# Altium footprint library tsl_Pcblib.PcbLib: 219 footprints (part 13 of 14)
Each footprint in its own frame and in the unit in brackets; x right, y up, seen from the top. Pads: shape width x height; smd on the part's side, far side on the other; paste and mask are expansions set on the pad; w line width, h text height; cw(c..) or ccw(c..) is an arc to the next point about the centre after c.
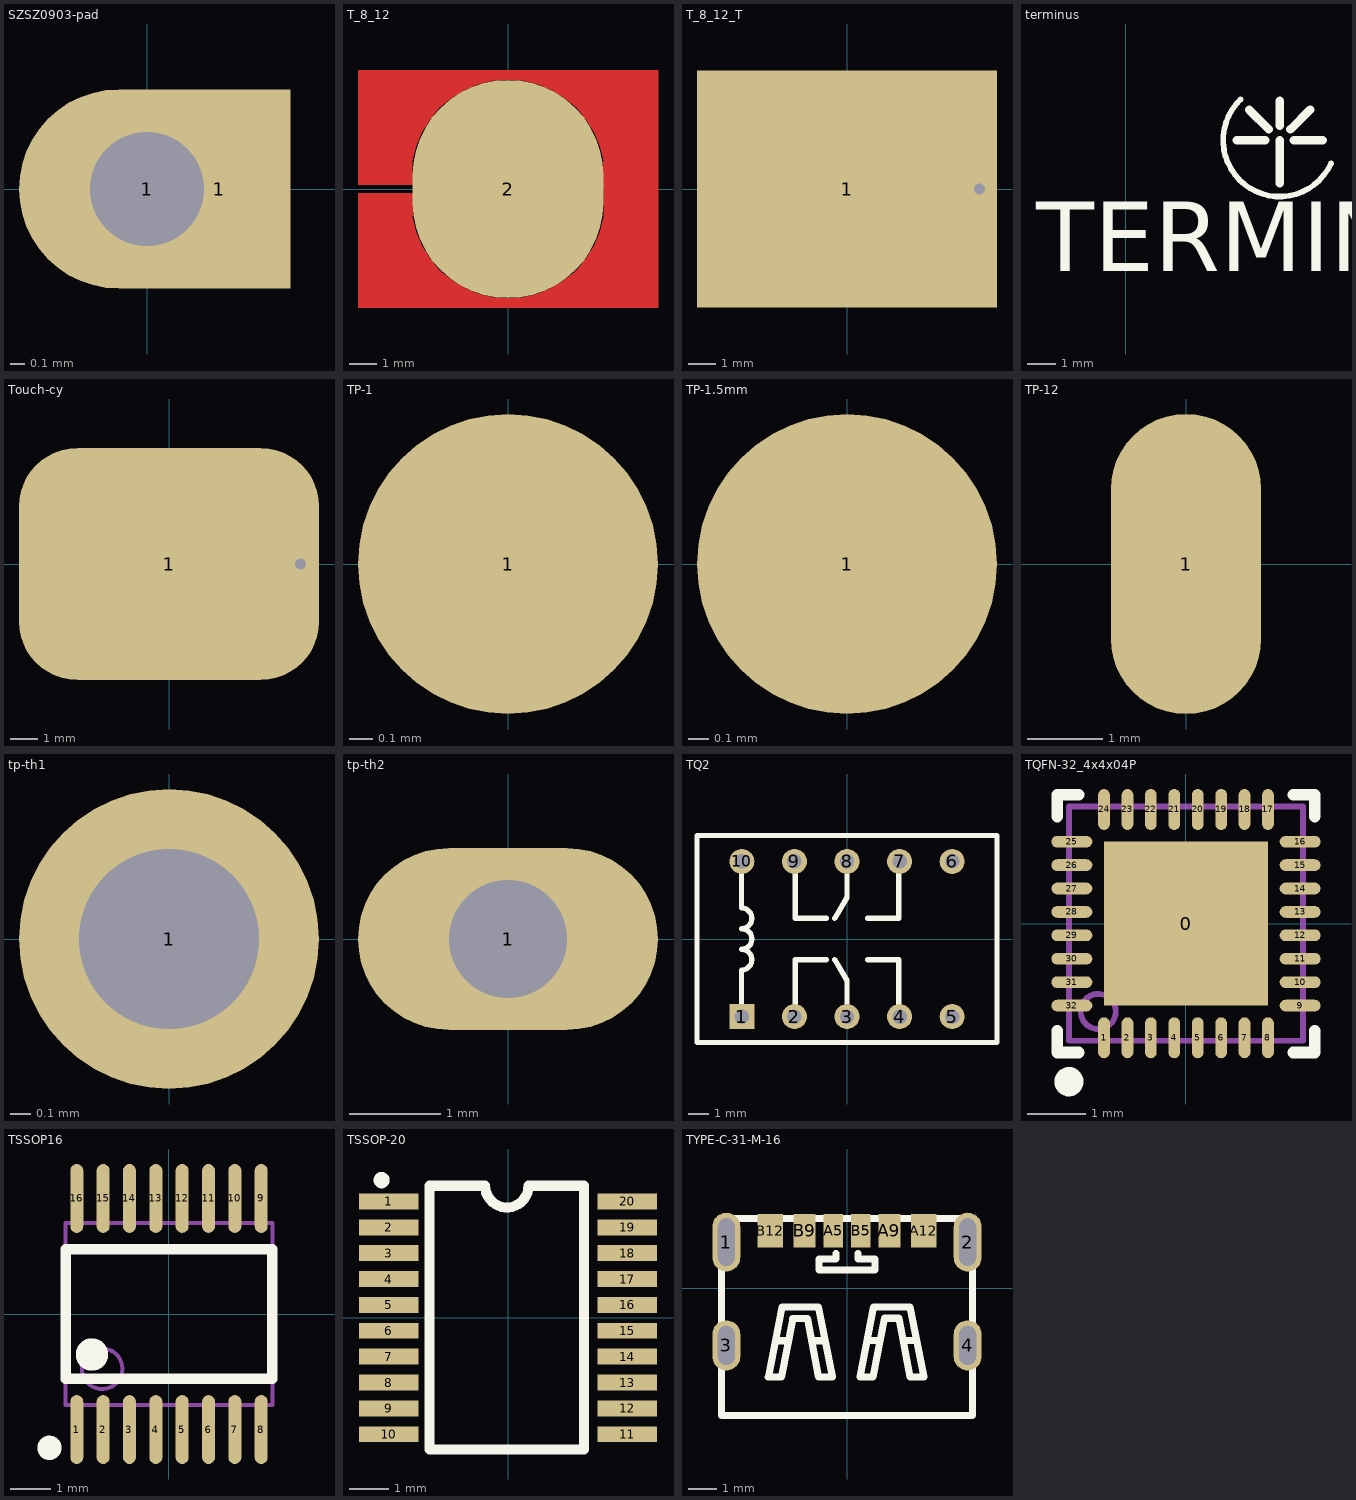
[diagram p12: the footprints below, top view; thin cyan lines are the x and y axes]

## SZSZ0903-pad [mm]
pads (2):
  oval 1.8x1.4 hole 0.8: 1(0,0)
  rect 1x1.4 smd: 1(0.508,0)

## T_8_12 [mm]
pads (2):
  round 0.01 smd: 1(-4.5,-3.4)
  oval 7x8 smd: 2(0,0)
Top Layer:
  region: 5.5,-4.35 5.5,4.35 -5.5,4.35 -5.5,0.15 -3.5,0.15 -3.51,1.003 -3.509,1.016 -3.378,1.558 -3.165,2.073 -2.874,2.548 -2.512,2.972 -2.088,3.334 -1.613,3.625 -1.098,3.838 -0.556,3.969 0,4.012 0.556,3.969 1.098,3.838 1.613,3.625 2.088,3.334 2.512,2.972 2.874,2.548 3.165,2.073 3.378,1.558 3.509,1.016 3.51,0.997 3.5,1 3.51,-1.003 3.509,-1.016 3.378,-1.558 3.165,-2.073 2.874,-2.548 2.512,-2.972 2.088,-3.334 1.613,-3.625 1.098,-3.838 0.556,-3.969 0,-4.012 -0.556,-3.969 -1.098,-3.838 -1.613,-3.625 -2.088,-3.334 -2.512,-2.972 -2.874,-2.548 -3.165,-2.073 -3.378,-1.558 -3.509,-1.016 -3.51,-0.997 -3.5,-1 -3.5,-0.15 -5.5,-0.15 -5.5,-4.35

## T_8_12_T [mil]
pads (1):
  rect 430x340 smd: 1(0,0)
via 190,0 diameter 30 hole 16

## terminus [mm]
Top Overlay:
  lines w0.2: 4.075,11.348 ccw(c5.461,9.906) 7.283,9.081
  lines w0.3: 3.937,9.906 4.953,9.906 ; 4.381,10.986 5.08,10.287 ; 5.461,8.382 5.461,9.906 ; 5.461,10.414 5.461,11.303 ; 5.842,10.287 6.54,10.986 ; 5.969,9.906 6.985,9.906
  text "TERMINUS" at -3.175,4.445 h4.2

## Touch-cy [mm]
pads (1):
  rrect50% 11x8.5 smd paste-12 mask-12: 1(0,0)
via 4.826,0 diameter 0.762 hole 0.406

## TP-1 [mm]
pads (1):
  round 1.3 smd: 1(0,0)

## TP-1.5mm [mm]
pads (1):
  round 1.5 smd: 1(0,0)

## TP-12 [mm]
pads (1):
  oval 2x4 smd: 1(0,0)

## tp-th1 [mm]
pads (1):
  round 1.5 hole 0.9: 1(0,0)

## tp-th2 [mm]
pads (1):
  oval 3.3x2 hole 1.3: 1(0,0)

## TQ2 [mm]
pads (10):
  rect 1.2x1.21 / inner rect 1.2x1.21 / far side rect 1.5x1.51 hole 0.7: 1(-5.08,-3.75)
  oval 1.2x1.21 / inner oval 1.2x1.21 / far side oval 1.5x1.51 hole 0.7: 2(-2.54,-3.75) 3(0,-3.75) 4(2.54,-3.75) 5(5.08,-3.75) 6(5.08,3.75) 7(2.54,3.75) 8(0,3.75) 9(-2.54,3.75) 10(-5.08,3.75)
Top Overlay:
  lines w0.254: -5.1,-3.7 -5.1,-1.5 ccw(c-5.1,-1) -5.1,-0.5 ccw(c-5.1,0) -5.1,0.5 ccw(c-5.1,1) -5.1,1.5 -5.1,3.7 ; -2.5,-3.7 -2.5,-1 -1,-1 ; -2.5,3.9 -2.5,1 -1,1 ; -0.6,-1 0,-2 0,-3.9 ; -0.6,1 0,2 0,3.6 ; 1,-1 2.5,-1 2.5,-3.7 ; 1,1 2.5,1 2.5,3.7 ; -7.25,-5 -7.25,5 7.25,5 7.25,-5 -7.25,-5

## TQFN-32_4X4 [mm]

## TQFN-32_4x4x04P [mm]
pads (33):
  rect 2.8x2.8 smd paste-0.025 mask+0.051: 0(0,0)
  oval 0.2x0.7 smd paste-0.025 mask+0.051: 1(-1.4,-1.95) 2(-1,-1.95) 3(-0.6,-1.95) 4(-0.2,-1.95) 5(0.2,-1.95) 6(0.6,-1.95) 7(1,-1.95) 8(1.4,-1.95) 17(1.4,1.95) 18(1,1.95) 19(0.6,1.95) 20(0.2,1.95) 21(-0.2,1.95) 22(-0.6,1.95) 23(-1,1.95) 24(-1.4,1.95)
  oval 0.7x0.2 smd paste-0.025 mask+0.051: 9(1.95,-1.4) 10(1.95,-1) 11(1.95,-0.6) 12(1.95,-0.2) 13(1.95,0.2) 14(1.95,0.6) 15(1.95,1) 16(1.95,1.4) 25(-1.95,1.4) 26(-1.95,1) 27(-1.95,0.6) 28(-1.95,0.2) 29(-1.95,-0.2) 30(-1.95,-0.6) 31(-1.95,-1) 32(-1.95,-1.4)
Top Overlay:
  circle w0.25: c-2,-2.7 r0.125
  lines w0.2: -2.2,-1.83 -2.2,-2.2 -1.83,-2.2 ; -2.2,1.83 -2.2,2.2 -1.83,2.2 ; 1.83,-2.2 2.2,-2.2 2.2,-1.83 ; 1.83,2.2 2.2,2.2 2.2,1.83
Mechanical 13:
  circle w0.1: c-1.5,-1.5 r0.3
  lines w0.1: -2,-2 -2,2 2,2 2,-2 -2,-2
3D body: height 0.25, standoff 0, extent -2.007,-1.981 2.007,2.007

## TSSOP16 [mm]
pads (16):
  oval 0.32x1.7 smd: 1(-2.275,-2.85) 2(-1.625,-2.85) 3(-0.975,-2.85) 4(-0.325,-2.85) 5(0.325,-2.85) 6(0.975,-2.85) 7(1.625,-2.85) 8(2.275,-2.85) 9(2.275,2.85) 10(1.625,2.85) 11(0.975,2.85) 12(0.325,2.85) 13(-0.325,2.85) 14(-0.975,2.85) 15(-1.625,2.85) 16(-2.275,2.85)
Top Overlay:
  circle w0.4: c-1.9,-1 r0.2
  circle w0.3: c-2.95,-3.3 r0.15
  lines w0.254: -2.55,-1.6 2.55,-1.6 2.55,1.6 -2.55,1.6 -2.55,-1.6
Mechanical 13:
  circle w0.1: c-1.65,-1.35 r0.5
  lines w0.1: -2.55,-2.25 2.55,-2.25 2.55,2.25 -2.55,2.25 -2.55,-2.25

## TSSOP-20 [mm]
pads (20):
  rect 1.494x0.4 smd: 1(-3.001,2.925) 2(-3.001,2.275) 3(-3.001,1.625) 4(-3.001,0.975) 5(-3.001,0.325) 6(-3.001,-0.324) 7(-3.001,-0.975) 8(-3.001,-1.625) 9(-3.001,-2.275) 10(-3.001,-2.925) 11(3.001,-2.925) 12(3.001,-2.275) 13(3.001,-1.625) 14(3.001,-0.975) 15(3.001,-0.325) 16(3.001,0.325) 17(3.001,0.975) 18(2.996,1.625) 19(2.996,2.275) 20(3.001,2.925)
Top Overlay:
  circle w0.254: c-3.176,3.458 r0.076
  lines w0.254: -1.972,3.291 -1.972,-3.311 1.914,-3.311 1.914,3.319 0.517,3.319 cw(c-0.029,3.319) -0.575,3.319 ; -1.972,3.319 -0.601,3.319

## TYPE-C-31-M-16 [mm]
pads (10):
  oval 1x2.1 hole 0.6 slot 1.7 at 90 deg: 1(-4.32,1.65) 2(4.32,1.65)
  oval 1x1.8 hole 0.6 slot 1.4 at 90 deg: 3(-4.32,-2.05) 4(4.32,-2.05)
  rect 0.7x1.2 smd: A5(-0.5,2.05) B5(0.5,2.05)
  rect 0.8x1.2 smd: A9(1.52,2.05) B9(-1.52,2.05)
  rect 0.9x1.2 smd: A12(2.75,2.05) B12(-2.75,2.05)
Top Overlay:
  lines w0.25: -4.5,-4.55 4.5,-4.55 ; -4.5,-4.5 -4.5,2.49 2.794,2.489 4.5,2.49 4.5,-4.5 ; -1.01,0.65 1.01,0.65 ; -1,0.65 -1,1.05 -0.4,1.05 -0.4,1.25 ; 0.4,1.25 0.4,1.05 1,1.05 1,0.65
  lines w0.254: -2.518,-1.883 -2.119,-1.883 ; -1.219,-1.882 -0.819,-1.882 ; 0.759,-1.878 1.158,-1.878 ; 2.058,-1.877 2.458,-1.877 ; -2.818,-3.183 -2.343,-3.183 -1.941,-1.083 -1.413,-1.083 -1.014,-3.183 -0.519,-3.183 -1.019,-0.681 -2.32,-0.681 -2.818,-3.183 ; 0.459,-3.178 0.934,-3.178 1.335,-1.078 1.864,-1.078 2.263,-3.178 2.758,-3.178 2.257,-0.676 0.957,-0.676 0.459,-3.178